# Altium integrated library 张方林_Library.IntLib: 375 symbols (part 2 of 3)
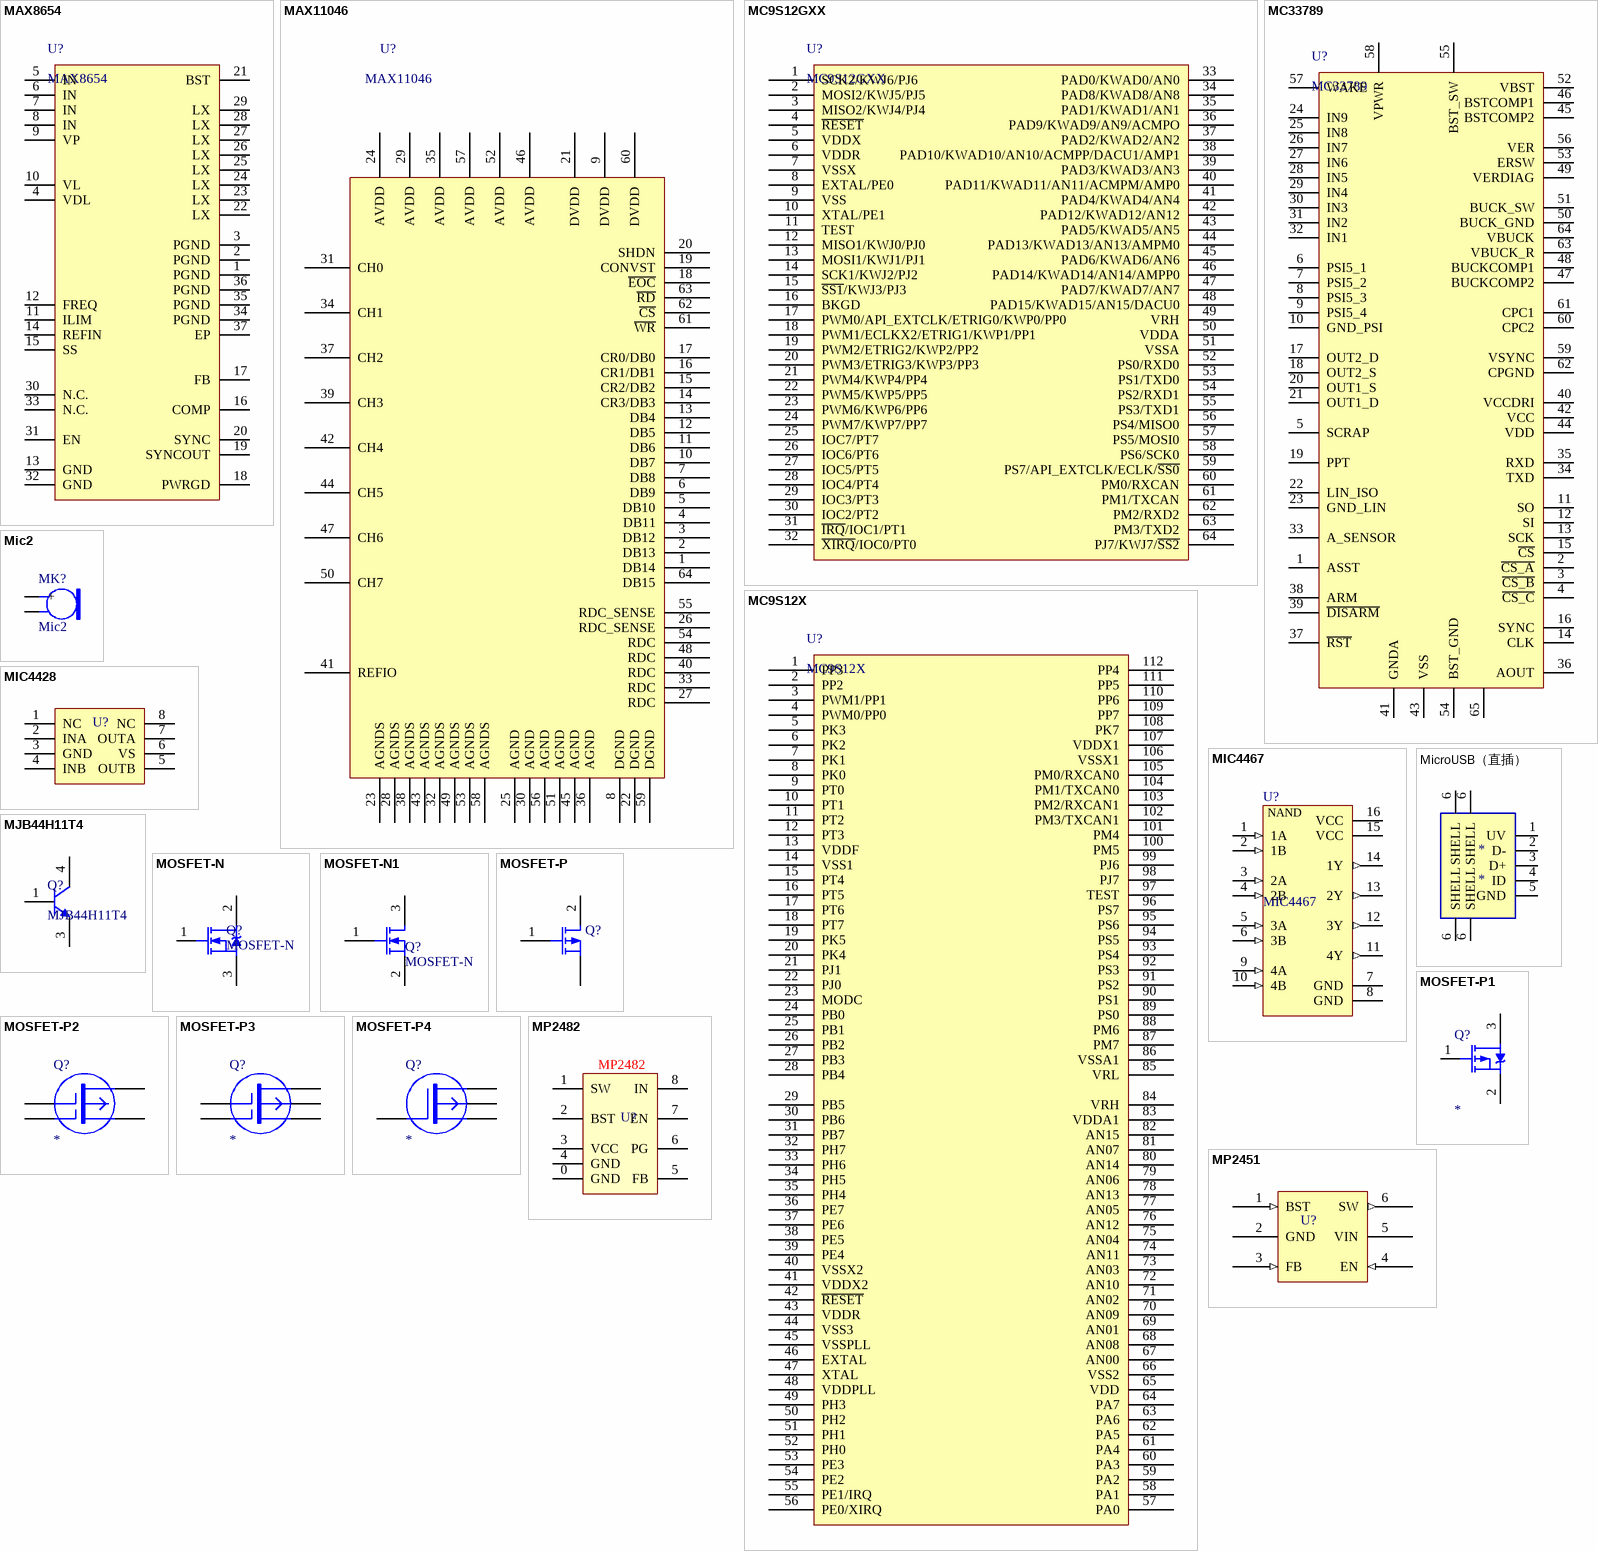
[diagram p20: symbols MAX8654 to MP2482]

## MC9S12X
designator U?
飞思卡尔单片机
footprint LQFP112 (Footprint not found)
pins: 1 PP3, 2 PP2, 3 PWM1/PP1, 4 PWM0/PP0, 5 PK3, 6 PK2, 7 PK1, 8 PK0, 9 PT0, 10 PT1, 11 PT2, 12 PT3, 13 VDDF, 14 VSS1, 15 PT4, 16 PT5, 17 PT6, 18 PT7, 19 PK5, 20 PK4, 21 PJ1, 22 PJ0, 23 MODC, 24 PB0, 25 PB1, 26 PB2, 27 PB3, 28 PB4, 29 PB5, 30 PB6, 31 PB7, 32 PH7, 33 PH6, 34 PH5, 35 PH4, 36 PE7, 37 PE6, 38 PE5, 39 PE4, 40 VSSX2, 41 VDDX2, 42 ~{RESET}, 43 VDDR, 44 VSS3, 45 VSSPLL, 46 EXTAL, 47 XTAL, 48 VDDPLL, 49 PH3, 50 PH2, 51 PH1, 52 PH0, 53 PE3, 54 PE2, 55 PE1/IRQ, 56 PE0/XIRQ, 57 PA0, 58 PA1, 59 PA2, 60 PA3, 61 PA4, 62 PA5, 63 PA6, 64 PA7, 65 VDD, 66 VSS2, 67 AN00, 68 AN08, 69 AN01, 70 AN09, 71 AN02, 72 AN10, 73 AN03, 74 AN11, 75 AN04, 76 AN12, 77 AN05, 78 AN13, 79 AN06, 80 AN14, 81 AN07, 82 AN15, 83 VDDA1, 84 VRH, 85 VRL, 86 VSSA1, 87 PM7, 88 PM6, 89 PS0, 90 PS1, 91 PS2, 92 PS3, 93 PS4, 94 PS5, 95 PS6, 96 PS7, 97 TEST, 98 PJ7, 99 PJ6, 100 PM5, 101 PM4, 102 PM3/TXCAN1, 103 PM2/RXCAN1, 104 PM1/TXCAN0, 105 PM0/RXCAN0, 106 VSSX1, 107 VDDX1, 108 PK7, 109 PP7, 110 PP6, 111 PP5, 112 PP4

## MC33789
designator U?
飞思卡尔传感器
footprint LQFP-64P (LQFP散热)
pins: 1 ASST, 2 ~{CS_A}, 3 ~{CS_B}, 4 ~{CS_C}, 5 SCRAP, 6 PSI5_1, 7 PSI5_2, 8 PSI5_3, 9 PSI5_4, 10 GND_PSI, 11 SO, 12 SI, 13 SCK, 14 CLK, 15 ~{CS}, 16 SYNC, 17 OUT2_D, 18 OUT2_S, 19 PPT, 20 OUT1_S, 21 OUT1_D, 22 LIN_ISO, 23 GND_LIN, 24 IN9, 25 IN8, 26 IN7, 27 IN6, 28 IN5, 29 IN4, 30 IN3, 31 IN2, 32 IN1, 33 A_SENSOR, 34 TXD, 35 RXD, 36 AOUT, 37 ~{RST}, 38 ARM, 39 ~{DISARM}, 40 VCCDRI, 41 GNDA, 42 VCC, 43 VSS, 44 VDD, 45 BSTCOMP2, 46 BSTCOMP1, 47 BUCKCOMP2, 48 BUCKCOMP1, 49 VERDIAG, 50 BUCK_GND, 51 BUCK_SW, 52 VBST, 53 ERSW, 54 BST_GND, 55 BST_SW, 56 VER, 57 WAKE, 58 VPWR, 59 VSYNC, 60 CPC2, 61 CPC1, 62 CPGND, 63 VBUCK_R, 64 VBUCK, 65

## Mic2
designator MK?
Microphone; Published: 24-Mar-1999; LatestRevisionDate: 17-Jul-2002; LatestRevisionNote: Re-released for DXP Platform.; PackageReference: PIN2; Publisher: Altium Limited
footprint PIN2 (Photosensitive Diode; 2 Leads)
footprint MIC
pins: 1 +, 2

## MIC4428
designator U?  (value not drawn)
缓冲器
footprint SOIC-NB-8
pins: 1 NC, 2 INA, 3 GND, 4 INB, 5 OUTB, 6 VS, 7 OUTA, 8 NC

## MIC4467
designator U?
Peripheral Driver; Package Information: Latest Revision: Jan-1998; Published: 15-May-2002; Datasheet: 1991 Interface Circuits Data Book (May-1990); Package Reference: D008; Publisher: Altium Limited
footprint SOIC-16W (SOIC)
pins: 1 1A (in), 2 1B (in), 3 2A (in), 4 2B (in), 5 3A (in), 6 3B (in), 7 GND, 8 GND, 9 4A (in), 10 4B (in), 11 4Y (out), 12 3Y (out), 13 2Y (out), 14 1Y (out), 15 VCC (power), 16 VCC (power)
text: NAND

## MicroUSB（直插）
designator *
footprint MINI  USB
footprint MicroUSB（直插）
footprint Micro USB
pins: 1 UV, 2 D-, 3 D+, 4 ID, 5 GND, 6 SHELL, 6 SHELL, 6 SHELL, 6 SHELL

## MJB44H11T4
designator Q?
footprint TO263-2 (LM2940/LM1086)
pins: 1 B, 3 E, 4 C

## MOSFET-N
designator Q?
N-Channel MOSFET; PackageDocument: 1995/1996; Published: 8-Jun-2000; LatestRevisionDate: 17-Jul-2002; LatestRevisionNote: Re-released for DXP Platform.; PackageReference: E3; Publisher: Altium Limited
footprint TO220-3 (TO, Thru-Hole, Vertical, Heatsink Mounted; 3 In-Line Leads; Pitch 2.54 mm)
footprint TO252-3 (D2-PAK)
pins: 1 G, 2 D, 3 S

## MOSFET-N1
designator Q?, comment MOSFET-N
MOSFET; Published: 8-Jun-2000; LatestRevisionDate: 17-Jul-2002; LatestRevisionNote: Re-released for DXP Platform.; PackageVersion: 1995/1996; PackageReference: E3; Publisher: Altium Limited
footprint SOT416
pins: 1 G, 2 S, 3 D

## MOSFET-P
designator Q?  (value not drawn)
P-Channel MOSFET; PackageDocument: 1995/1996; Published: 8-Jun-2000; LatestRevisionDate: 17-Jul-2002; LatestRevisionNote: Re-released for DXP Platform.; PackageReference: E3; Publisher: Altium Limited
footprint TO220-3 (TO, Thru-Hole, Vertical, Heatsink Mounted; 3 In-Line Leads; Pitch 2.54 mm)
pins: 1 G, 2 D, 3 S

## MOSFET-P1
designator Q?
footprint SOT23-3
pins: 1 G, 2 S, 3 D

## MOSFET-P2
designator Q?
pins: 1 G1, 2 G2, 3 D, 4 S

## MOSFET-P3
designator Q?
pins: 1 G1, 2 G2, 3 D, 4 U, 5 S

## MOSFET-P4
designator Q?
pins: 1 G, 2 D, 3 U, 4 S

## MP2451
designator U?  (value not drawn)
footprint SOT23-6
pins: 1 BST (in), 2 GND (power), 3 FB (in), 4 EN (in), 5 VIN (power), 6 SW (out)

## MP2482
designator U?  (value not drawn)
5A开关电源芯片
footprint POWERPARK SOP8
pins: 0 GND, 1 SW, 2 BST, 3 VCC, 4 GND, 5 FB, 6 PG, 7 EN, 8 IN

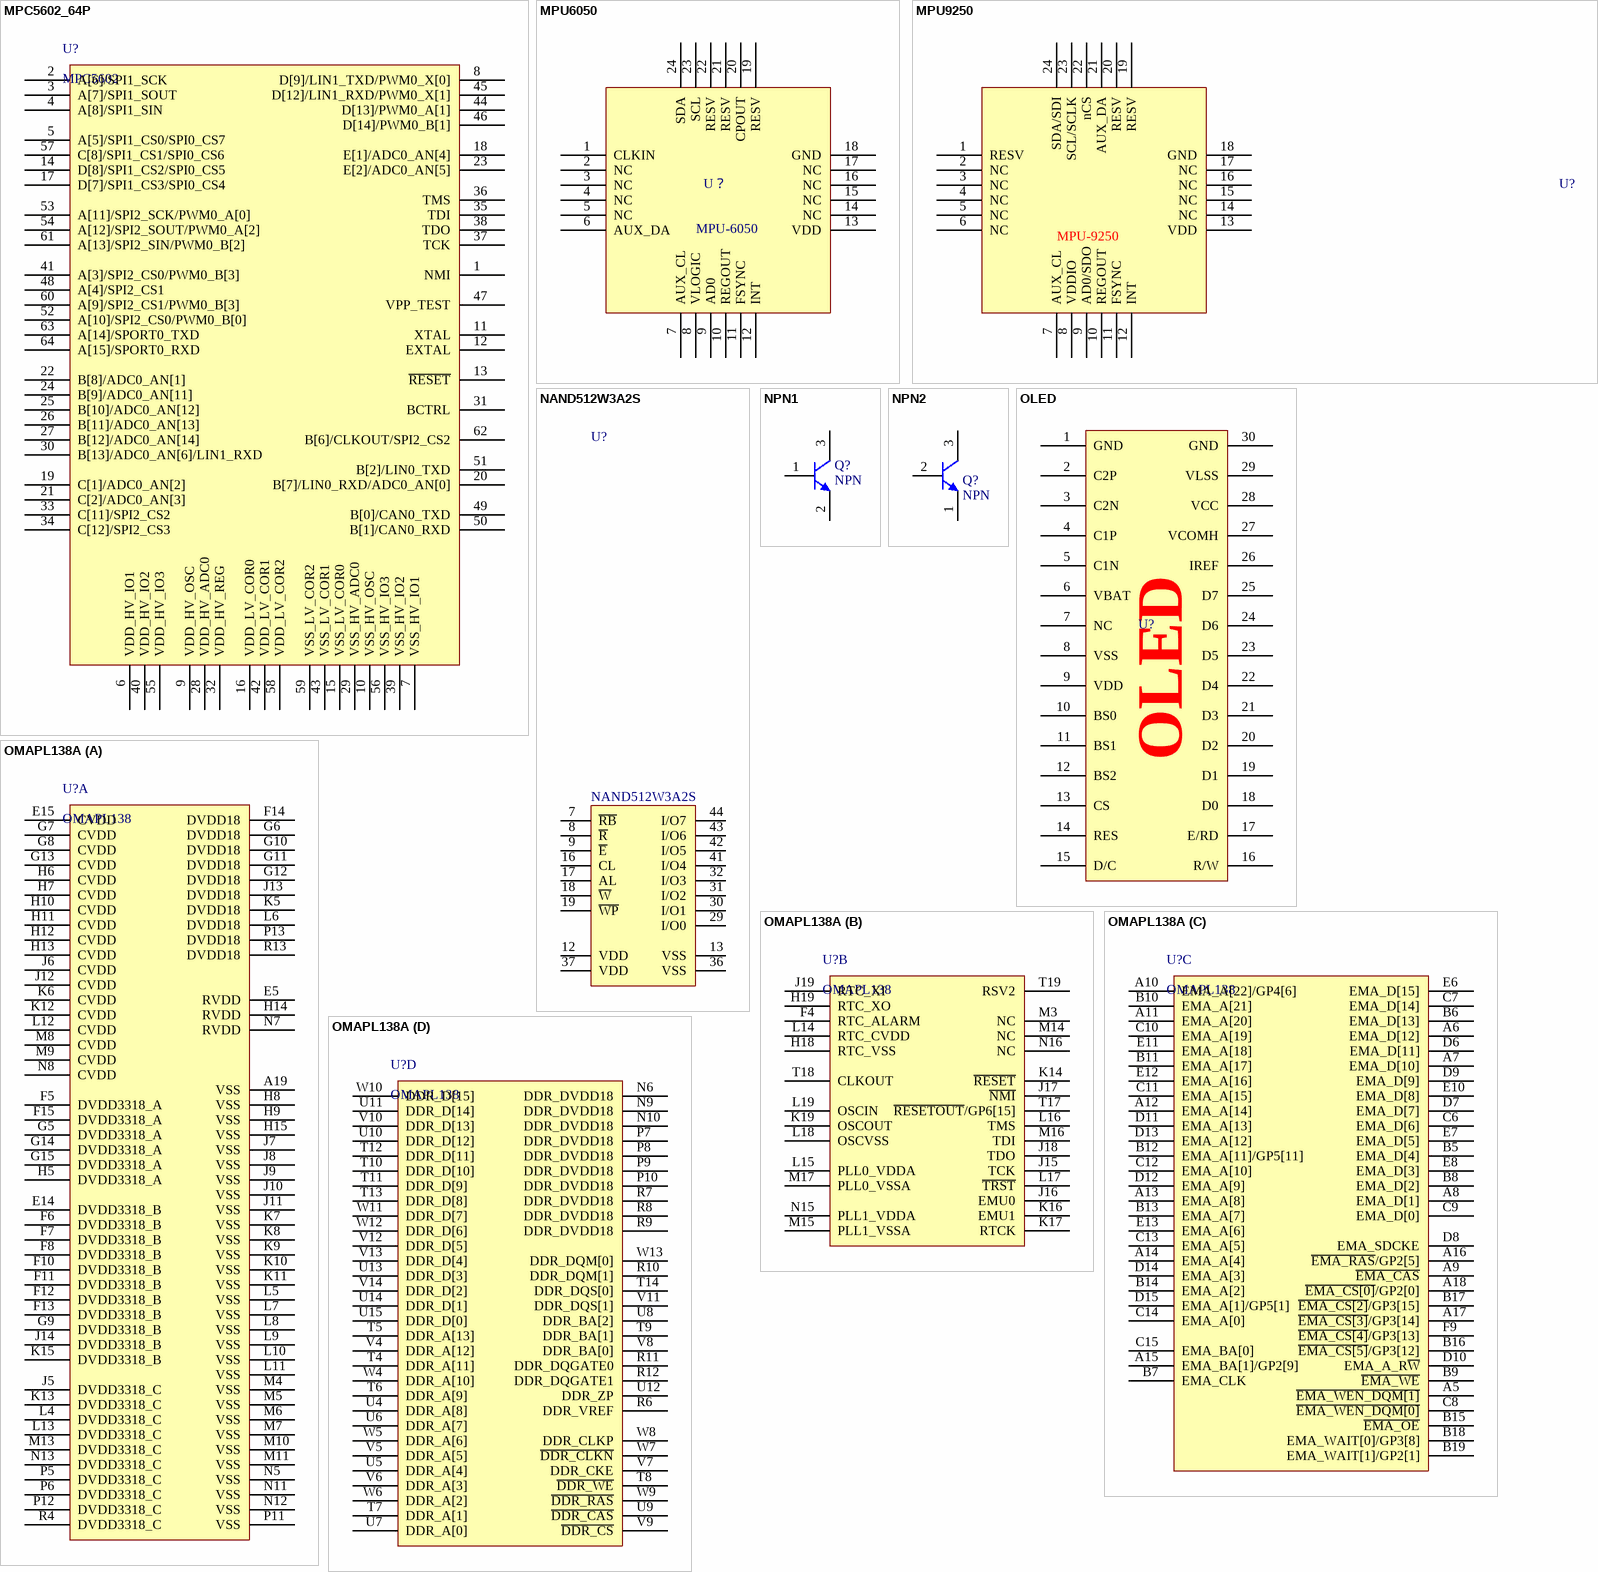
[diagram p9: symbols MPC5602_64P to OMAPL138A]

## MPC5602_64P
designator U?, comment MPC5602
Freescale PowerPC
footprint LQFP-64 (LQFP64)
pins: 1 NMI, 2 A[6]/SPI1_SCK, 3 A[7]/SPI1_SOUT, 4 A[8]/SPI1_SIN, 5 A[5]/SPI1_CS0/SPI0_CS7, 6 VDD_HV_IO1, 7 VSS_HV_IO1, 8 D[9]/LIN1_TXD/PWM0_X[0], 9 VDD_HV_OSC, 10 VSS_HV_OSC, 11 XTAL, 12 EXTAL, 13 ~{RESET}, 14 D[8]/SPI1_CS2/SPI0_CS5, 15 VSS_LV_COR0, 16 VDD_LV_COR0, 17 D[7]/SPI1_CS3/SPI0_CS4, 18 E[1]/ADC0_AN[4], 19 C[1]/ADC0_AN[2], 20 B[7]/LIN0_RXD/ADC0_AN[0], 21 C[2]/ADC0_AN[3], 22 B[8]/ADC0_AN[1], 23 E[2]/ADC0_AN[5], 24 B[9]/ADC0_AN[11], 25 B[10]/ADC0_AN[12], 26 B[11]/ADC0_AN[13], 27 B[12]/ADC0_AN[14], 28 VDD_HV_ADC0, 29 VSS_HV_ADC0, 30 B[13]/ADC0_AN[6]/LIN1_RXD, 31 BCTRL, 32 VDD_HV_REG, 33 C[11]/SPI2_CS2, 34 C[12]/SPI2_CS3, 35 TDI, 36 TMS, 37 TCK, 38 TDO, 39 VSS_HV_IO2, 40 VDD_HV_IO2, 41 A[3]/SPI2_CS0/PWM0_B[3], 42 VDD_LV_COR1, 43 VSS_LV_COR1, 44 D[13]/PWM0_A[1], 45 D[12]/LIN1_RXD/PWM0_X[1], 46 D[14]/PWM0_B[1], 47 VPP_TEST, 48 A[4]/SPI2_CS1, 49 B[0]/CAN0_TXD, 50 B[1]/CAN0_RXD, 51 B[2]/LIN0_TXD, 52 A[10]/SPI2_CS0/PWM0_B[0], 53 A[11]/SPI2_SCK/PWM0_A[0], 54 A[12]/SPI2_SOUT/PWM0_A[2], 55 VDD_HV_IO3, 56 VSS_HV_IO3, 57 C[8]/SPI1_CS1/SPI0_CS6, 58 VDD_LV_COR2, 59 VSS_LV_COR2, 60 A[9]/SPI2_CS1/PWM0_B[3], 61 A[13]/SPI2_SIN/PWM0_B[2], 62 B[6]/CLKOUT/SPI2_CS2, 63 A[14]/SPORT0_TXD, 64 A[15]/SPORT0_RXD

## MPU6050
designator U？  (value not drawn)
footprint MPU6050
pins: 1 CLKIN, 2 NC, 3 NC, 4 NC, 5 NC, 6 AUX_DA, 7 AUX_CL, 8 VLOGIC, 9 AD0, 10 REGOUT, 11 FSYNC, 12 INT, 13 VDD, 14 NC, 15 NC, 16 NC, 17 NC, 18 GND, 19 RESV, 20 CPOUT, 21 RESV, 22 RESV, 23 SCL, 24 SDA
text: MPU-6050

## MPU9250
designator U?  (value not drawn)
九轴陀螺仪
footprint MPU9250
pins: 1 RESV, 2 NC, 3 NC, 4 NC, 5 NC, 6 NC, 7 AUX_CL, 8 VDDIO, 9 AD0/SDO, 10 REGOUT, 11 FSYNC, 12 INT, 13 VDD, 14 NC, 15 NC, 16 NC, 17 NC, 18 GND, 19 RESV, 20 RESV, 21 AUX_DA, 22 nCS, 23 SCL/SCLK, 24 SDA/SDI
text: MPU-9250

## NAND512W3A2S
designator U?
NANDFLASH
footprint TSOP-48
pins: 1 NC hidden, 2 NC hidden, 3 NC hidden, 4 NC hidden, 5 NC hidden, 6 NC hidden, 7 ~{RB}, 8 ~{R}, 9 ~{E}, 10 NC hidden, 11 NC hidden, 12 VDD, 13 VSS, 14 NC hidden, 15 NC hidden, 16 CL, 17 AL, 18 ~{W}, 19 ~{WP}, 20 NC hidden, 21 NC hidden, 22 NC hidden, 23 NC hidden, 24 NC hidden, 25 NC hidden, 26 NC hidden, 27 NC hidden, 28 NC hidden, 29 I/O0, 30 I/O1, 31 I/O2, 32 I/O3, 33 NC hidden, 34 NC hidden, 35 NC hidden, 36 VSS, 37 VDD, 38 NC hidden, 39 NC hidden, 40 NC hidden, 41 I/O4, 42 I/O5, 43 I/O6, 44 I/O7, 45 NC hidden, 46 NC hidden, 47 NC hidden, 48 NC hidden

## NPN1
designator Q?, comment NPN
贴片三极管; Published: 8-Jun-2000; LatestRevisionDate: 15-Jan-2003; LatestRevisionNote: PCB Footprint 'BCY-W3/D4.7' replaced; DatasheetDocument: 1997; PackageDocument: Sep-1998; PackageReference: TO-92A; Publisher: Altium Limited; Code_JEDEC: TO-92A; ComponentLink1Description: Manufacturer Link; ComponentLink1URL: http://www.fairchildsemi.com/; ComponentLink2Description: Datasheet; ComponentLink2URL: http://www.fairchildsemi.com/ds/2N%2F2N3904.pdf
footprint SOT23-3
pins: 1 B, 2 E, 3 C

## NPN2
designator Q?, comment NPN
三极管; Published: 8-Jun-2000; LatestRevisionDate: 15-Jan-2003; LatestRevisionNote: PCB Footprint 'BCY-W3/D4.7' replaced; DatasheetDocument: 1997; PackageDocument: Sep-1998; PackageReference: TO-92A; Publisher: Altium Limited; Code_JEDEC: TO-92A; ComponentLink1Description: Manufacturer Link; ComponentLink1URL: http://www.fairchildsemi.com/; ComponentLink2Description: Datasheet; ComponentLink2URL: http://www.fairchildsemi.com/ds/2N%2F2N3904.pdf
footprint TO-92A (TO, Flat Index; 3 In-Line, Axial Leads; Body Dia. 4.5mm; Leads 0.51 x 0.48 mm (max))
pins: 1 E, 2 B, 3 C

## OLED
designator U?  (value not drawn)
footprint OLED
pins: 1 GND, 2 C2P, 3 C2N, 4 C1P, 5 C1N, 6 VBAT, 7 NC, 8 VSS, 9 VDD, 10 BS0, 11 BS1, 12 BS2, 13 CS, 14 RES, 15 D/C, 16 R/W, 17 E/RD, 18 D0, 19 D1, 20 D2, 21 D3, 22 D4, 23 D5, 24 D6, 25 D7, 26 IREF, 27 VCOMH, 28 VCC, 29 VLSS, 30 GND

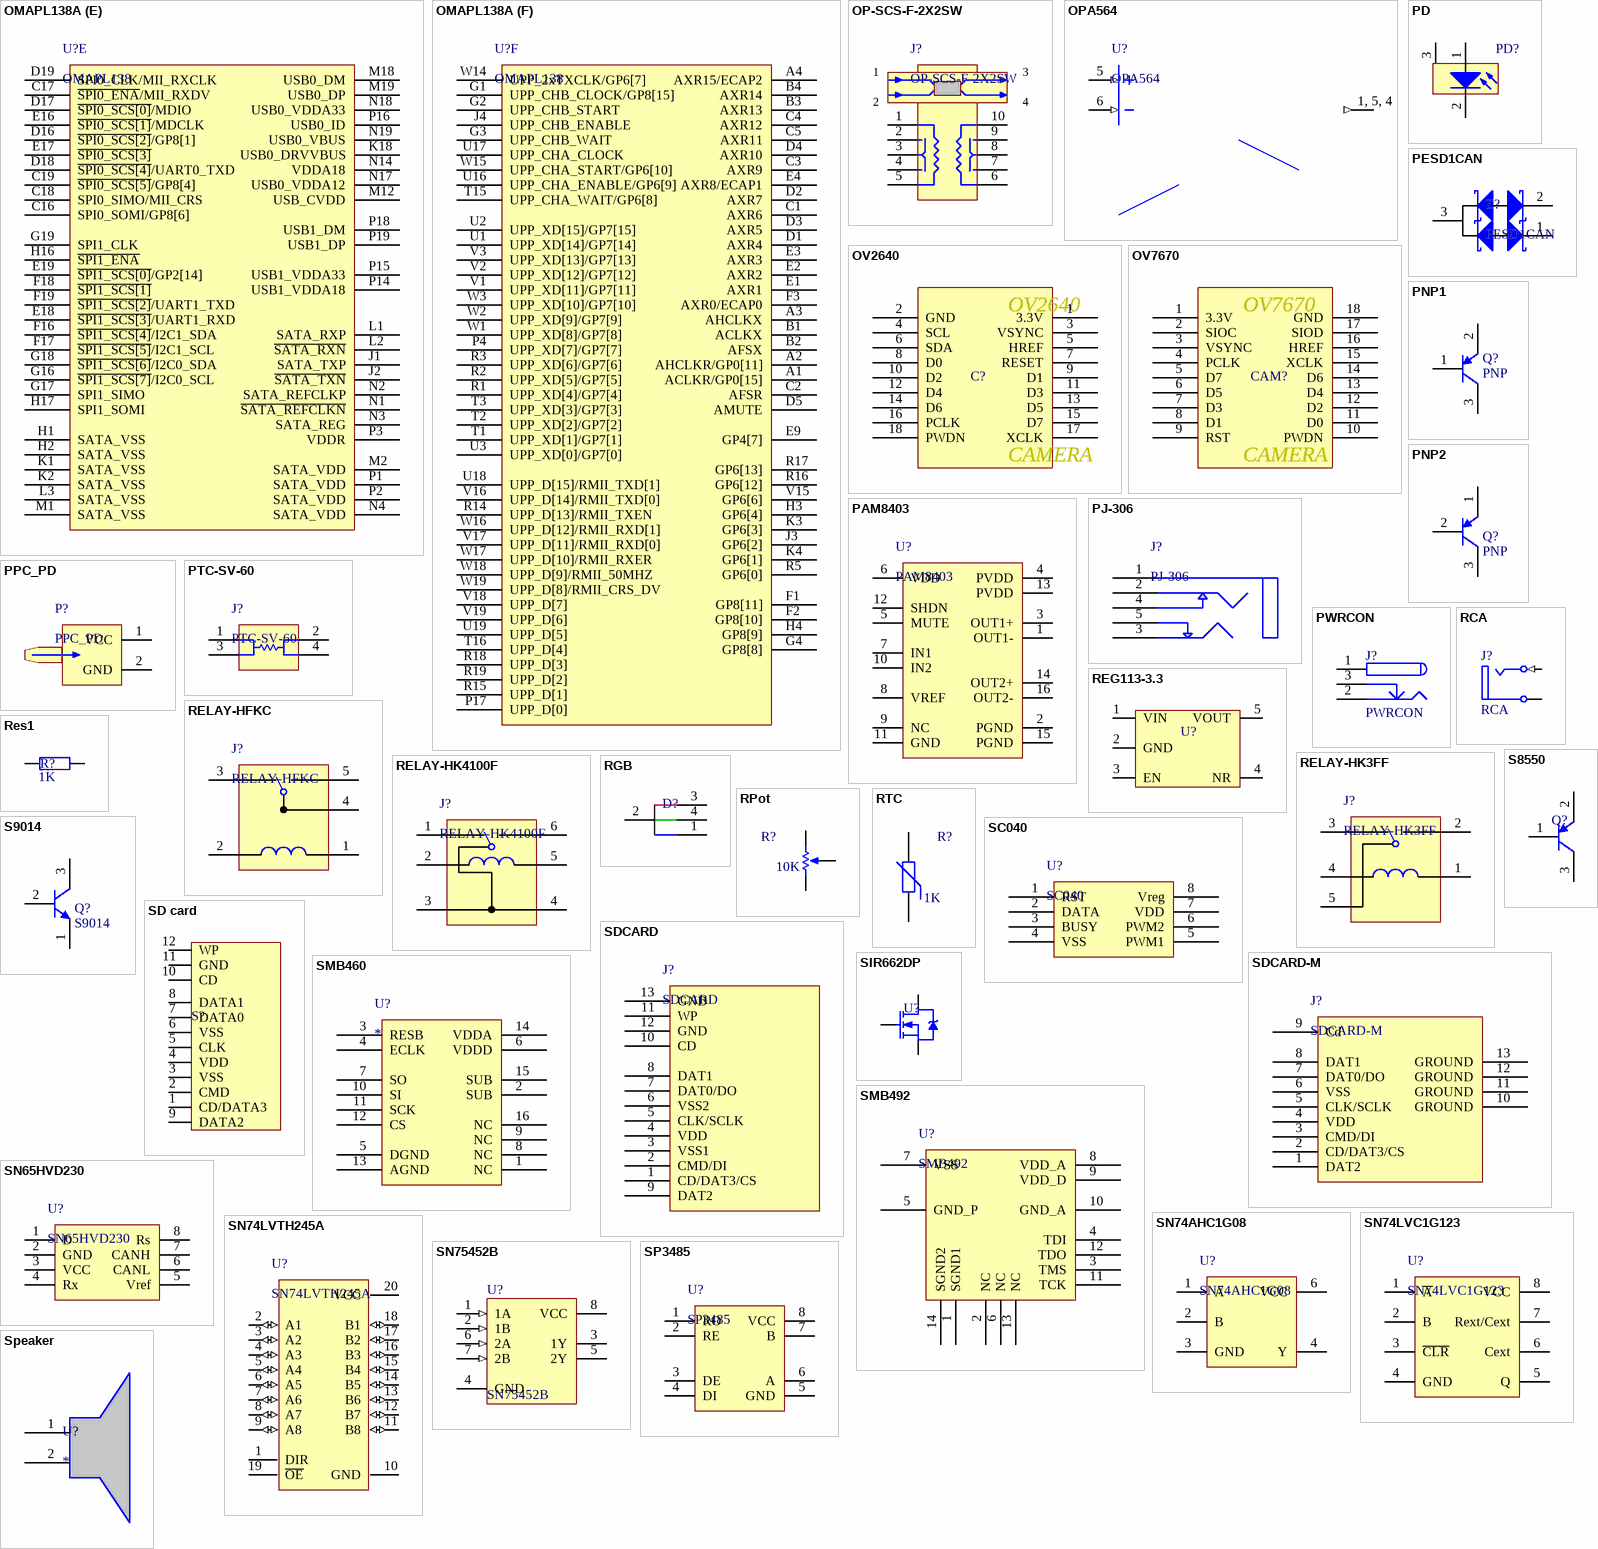
[diagram p10: symbols OMAPL138A to Speaker]

## OMAPL138A
designator U?, comment OMAPL138
DSP&ARM
footprint UFBGA361
part A pins: A19 VSS, E5 RVDD, E14 DVDD3318_B, E15 CVDD, F5 DVDD3318_A, F6 DVDD3318_B, F7 DVDD3318_B, F8 DVDD3318_B, F10 DVDD3318_B, F11 DVDD3318_B, F12 DVDD3318_B, F13 DVDD3318_B, F14 DVDD18, F15 DVDD3318_A, G5 DVDD3318_A, G6 DVDD18, G7 CVDD, G8 CVDD, G9 DVDD3318_B, G10 DVDD18, G11 DVDD18, G12 DVDD18, G13 CVDD, G14 DVDD3318_A, G15 DVDD3318_A, H5 DVDD3318_A, H6 CVDD, H7 CVDD, H8 VSS, H9 VSS, H10 CVDD, H11 CVDD, H12 CVDD, H13 CVDD, H14 RVDD, H15 VSS, J5 DVDD3318_C, J6 CVDD, J7 VSS, J8 VSS, J9 VSS, J10 VSS, J11 VSS, J12 CVDD, J13 DVDD18, J14 DVDD3318_B, K5 DVDD18, K6 CVDD, K7 VSS, K8 VSS, K9 VSS, K10 VSS, K11 VSS, K12 CVDD, K13 DVDD3318_C, K15 DVDD3318_B, L4 DVDD3318_C, L5 VSS, L6 DVDD18, L7 VSS, L8 VSS, L9 VSS, L10 VSS, L11 VSS, L12 CVDD, L13 DVDD3318_C, M4 VSS, M5 VSS, M6 VSS, M7 VSS, M8 CVDD, M9 CVDD, M10 VSS, M11 VSS, M13 DVDD3318_C, N5 VSS, N7 RVDD, N8 CVDD, N11 VSS, N12 VSS, N13 DVDD3318_C, P5 DVDD3318_C, P6 DVDD3318_C, P11 VSS, P12 DVDD3318_C, P13 DVDD18, R4 DVDD3318_C, R13 DVDD18
part B pins: F4 RTC_ALARM, H18 RTC_VSS, H19 RTC_XO, J15 TCK, J16 EMU0, J17 ~{NMI}, J18 TDO, J19 RTC_XI, K14 ~{RESET}, K16 EMU1, K17 RTCK, K19 OSCOUT, L14 RTC_CVDD, L15 PLL0_VDDA, L16 TMS, L17 ~{TRST}, L18 OSCVSS, L19 OSCIN, M3 NC, M14 NC, M15 PLL1_VSSA, M16 TDI, M17 PLL0_VSSA, N15 PLL1_VDDA, N16 NC, T17 ~{RESETOUT}/GP6[15], T18 CLKOUT, T19 RSV2
part C pins: A5 ~{EMA_WEN_DQM[1]}, A6 EMA_D[12], A7 EMA_D[10], A8 EMA_D[1], A9 ~{EMA_CAS}, A10 EMA_A[22]/GP4[6], A11 EMA_A[20], A12 EMA_A[14], A13 EMA_A[8], A14 EMA_A[4], A15 EMA_BA[1]/GP2[9], A16 ~{EMA_RAS}/GP2[5], A17 ~{EMA_CS[3]}/GP3[14], A18 ~{EMA_CS[0]}/GP2[0], B5 EMA_D[4], B6 EMA_D[13], B7 EMA_CLK, B8 EMA_D[2], B9 ~{EMA_WE}, B10 EMA_A[21], B11 EMA_A[17], B12 EMA_A[11]/GP5[11], B13 EMA_A[7], B14 EMA_A[2], B15 ~{EMA_OE}, B16 ~{EMA_CS[5]}/GP3[12], B17 ~{EMA_CS[2]}/GP3[15], B18 EMA_WAIT[0]/GP3[8], B19 EMA_WAIT[1]/GP2[1], C6 EMA_D[6], C7 EMA_D[14], C8 ~{EMA_WEN_DQM[0]}, C9 EMA_D[0], C10 EMA_A[19], C11 EMA_A[15], C12 EMA_A[10], C13 EMA_A[5], C14 EMA_A[0], C15 EMA_BA[0], D6 EMA_D[11], D7 EMA_D[7], D8 EMA_SDCKE, D9 EMA_D[9], D10 EMA_A_R~{W}, D11 EMA_A[13], D12 EMA_A[9], D13 EMA_A[12], D14 EMA_A[3], D15 EMA_A[1]/GP5[1], E6 EMA_D[15], E7 EMA_D[5], E8 EMA_D[3], E10 EMA_D[8], E11 EMA_A[18], E12 EMA_A[16], E13 EMA_A[6], F9 ~{EMA_CS[4]}/GP3[13]
part D pins: N6 DDR_DVDD18, N9 DDR_DVDD18, N10 DDR_DVDD18, P7 DDR_DVDD18, P8 DDR_DVDD18, P9 DDR_DVDD18, P10 DDR_DVDD18, R6 DDR_VREF, R7 DDR_DVDD18, R8 DDR_DVDD18, R9 DDR_DVDD18, R10 DDR_DQM[1], R11 DDR_DQGATE0, R12 DDR_DQGATE1, T4 DDR_A[11], T5 DDR_A[13], T6 DDR_A[9], T7 DDR_A[1], T8 ~{DDR_WE}, T9 DDR_BA[1], T10 DDR_D[10], T11 DDR_D[9], T12 DDR_D[11], T13 DDR_D[8], T14 DDR_DQS[0], U4 DDR_A[8], U5 DDR_A[4], U6 DDR_A[7], U7 DDR_A[0], U8 DDR_BA[2], U9 ~{DDR_CAS}, U10 DDR_D[12], U11 DDR_D[14], U12 DDR_ZP, U13 DDR_D[3], U14 DDR_D[1], U15 DDR_D[0], V4 DDR_A[12], V5 DDR_A[5], V6 DDR_A[3], V7 DDR_CKE, V8 DDR_BA[0], V9 ~{DDR_CS}, V10 DDR_D[13], V11 DDR_DQS[1], V12 DDR_D[5], V13 DDR_D[4], V14 DDR_D[2], W4 DDR_A[10], W5 DDR_A[6], W6 DDR_A[2], W7 ~{DDR_CLKN}, W8 DDR_CLKP, W9 ~{DDR_RAS}, W10 DDR_D[15], W11 DDR_D[7], W12 DDR_D[6], W13 DDR_DQM[0]
part E pins: C16 SPI0_SOMI/GP8[6], C17 ~{SPI0_ENA}/MII_RXDV, C18 SPI0_SIMO/MII_CRS, C19 ~{SPI0_SCS[5]}/GP8[4], D16 ~{SPI0_SCS[2]}/GP8[1], D17 ~{SPI0_SCS[0]}/MDIO, D18 ~{SPI0_SCS[4]}/UART0_TXD, D19 SPI0_CLK/MII_RXCLK, E16 ~{SPI0_SCS[1]}/MDCLK, E17 ~{SPI0_SCS[3]}, E18 ~{SPI1_SCS[3]}/UART1_RXD, E19 ~{SPI1_SCS[0]}/GP2[14], F16 ~{SPI1_SCS[4]}/I2C1_SDA, F17 ~{SPI1_SCS[5]}/I2C1_SCL, F18 ~{SPI1_SCS[1]}, F19 ~{SPI1_SCS[2]}/UART1_TXD, G16 ~{SPI1_SCS[7]}/I2C0_SCL, G17 SPI1_SIMO, G18 ~{SPI1_SCS[6]}/I2C0_SDA, G19 SPI1_CLK, H1 SATA_VSS, H2 SATA_VSS, H16 ~{SPI1_ENA}, H17 SPI1_SOMI, J1 SATA_TXP, J2 ~{SATA_TXN}, K1 SATA_VSS, K2 SATA_VSS, K18 USB0_DRVVBUS, L1 SATA_RXP, L2 ~{SATA_RXN}, L3 SATA_VSS, M1 SATA_VSS, M2 SATA_VDD, M12 USB_CVDD, M18 USB0_DM, M19 USB0_DP, N1 ~{SATA_REFCLKN}, N2 SATA_REFCLKP, N3 SATA_REG, N4 SATA_VDD, N14 VDDA18, N17 USB0_VDDA12, N18 USB0_VDDA33, N19 USB0_VBUS, P1 SATA_VDD, P2 SATA_VDD, P3 VDDR, P14 USB1_VDDA18, P15 USB1_VDDA33, P16 USB0_ID, P18 USB1_DM, P19 USB1_DP
part F pins: A1 ACLKR/GP0[15], A2 AHCLKR/GP0[11], A3 AHCLKX, A4 AXR15/ECAP2, B1 ACLKX, B2 AFSX, B3 AXR13, B4 AXR14, C1 AXR6, C2 AFSR, C3 AXR9, C4 AXR12, C5 AXR11, D1 AXR4, D2 AXR7, D3 AXR5, D4 AXR10, D5 AMUTE, E1 AXR1, E2 AXR2, E3 AXR3, E4 AXR8/ECAP1, E9 GP4[7], F1 GP8[11], F2 GP8[10], F3 AXR0/ECAP0, G1 UPP_CHB_CLOCK/GP8[15], G2 UPP_CHB_START, G3 UPP_CHB_WAIT, G4 GP8[8], H3 GP6[4], H4 GP8[9], J3 GP6[2], J4 UPP_CHB_ENABLE, K3 GP6[3], K4 GP6[1], P4 UPP_XD[7]/GP7[7], P17 UPP_D[0], R1 UPP_XD[4]/GP7[4], R2 UPP_XD[5]/GP7[5], R3 UPP_XD[6]/GP7[6], R5 GP6[0], R14 UPP_D[13]/RMII_TXEN, R15 UPP_D[1], R16 GP6[12], R17 GP6[13], R18 UPP_D[3], R19 UPP_D[2], T1 UPP_XD[1]/GP7[1], T2 UPP_XD[2]/GP7[2], T3 UPP_XD[3]/GP7[3], T15 UPP_CHA_WAIT/GP6[8], T16 UPP_D[4], U1 UPP_XD[14]/GP7[14], U2 UPP_XD[15]/GP7[15], U3 UPP_XD[0]/GP7[0], U16 UPP_CHA_ENABLE/GP6[9], U17 UPP_CHA_CLOCK, U18 UPP_D[15]/RMII_TXD[1], U19 UPP_D[5], V1 UPP_XD[11]/GP7[11], V2 UPP_XD[12]/GP7[12], V3 UPP_XD[13]/GP7[13], V15 GP6[6], V16 UPP_D[14]/RMII_TXD[0], V17 UPP_D[11]/RMII_RXD[0], V18 UPP_D[7], V19 UPP_D[6], W1 UPP_XD[8]/GP7[8], W2 UPP_XD[9]/GP7[9], W3 UPP_XD[10]/GP7[10], W14 UPP_2xTXCLK/GP6[7], W15 UPP_CHA_START/GP6[10], W16 UPP_D[12]/RMII_RXD[1], W17 UPP_D[10]/RMII_RXER, W18 UPP_D[9]/RMII_50MHZ, W19 UPP_D[8]/RMII_CRS_DV

## OP-SCS-F-2X2SW
designator J?
光开关
footprint SCS-F-2X2
pins: 1 SWA, 2 SWAK1, 3 SWAK2, 4 SWAK3, 5 SWA, 6 SWB, 7 SWBK3, 8 SWBK2, 9 SWBK1, 10 SWB

## OPA564
designator U?
功率运算放大器
footprint TSSOP-20P (TSOP, 20-Leads, Body 6.5x4.4mm, Pitch 0.65mm, IPC Low Density)
pins: 1, 5, 4  OUT (out), 5 IN+ (in), 6 IN- (in)

## OV2640
designator C?  (value not drawn)
摄像头
footprint OV2640
pins: 1 3.3V, 2 GND, 3 VSYNC, 4 SCL, 5 HREF, 6 SDA, 7 RESET, 8 D0, 9 D1, 10 D2, 11 D3, 12 D4, 13 D5, 14 D6, 15 D7, 16 PCLK, 17 XCLK, 18 PWDN
text: CAMERA

## OV7670
designator CAM?  (value not drawn)
摄像头
footprint OV7670
pins: 1 3.3V, 2 SIOC, 3 VSYNC, 4 PCLK, 5 D7, 6 D5, 7 D3, 8 D1, 9 RST, 10 PWDN, 11 D0, 12 D2, 13 D4, 14 D6, 15 XCLK, 16 HREF, 17 SIOD, 18 GND
text: CAMERA

## PAM8403
designator U?
音频运放
footprint SOIC-16
pins: 1 OUT1-, 2 PGND, 3 OUT1+, 4 PVDD, 5 MUTE, 6 VDD, 7 IN1, 8 VREF, 9 NC, 10 IN2, 11 GND, 12 SHDN, 13 PVDD, 14 OUT2+, 15 PGND, 16 OUT2-

## PD
designator PD?  (value not drawn)
光电二极管; Published: 24-Mar-1999; LatestRevisionDate: 17-Jul-2002; LatestRevisionNote: Re-released for DXP Platform.; Publisher: Altium Limited; PackageReference: PD
footprint PD
footprint PD-SMD (光电二极管)
footprint PD-H (光电二极管)
pins: 1 A, 2 K, 3 0

## PESD1CAN
designator Z?
过压保护
footprint SOT23-3
pins: 1, 2, 3

## PJ-306
designator J?
立体声耳机插座
footprint PJ-315-B (立体声耳机插座)
footprint PJ-306 (立体声耳机插座)
footprint 3F07 (立体声耳机插座)
pins: 1 COM, 2 L, 3 R, 4 L1, 5 R1

## PNP1
designator Q?, comment PNP
贴片三极管; Published: 8-Jun-2000; LatestRevisionDate: 15-Jan-2003; LatestRevisionNote: PCB Footprint 'BCY-W3/D4.7' replaced; DatasheetDocument: 1997; PackageDocument: Sep-1998; PackageReference: TO-92A; Publisher: Altium Limited; Code_JEDEC: TO-92A; ComponentLink1Description: Manufacturer Link; ComponentLink1URL: http://www.fairchildsemi.com/; ComponentLink2Description: Datasheet; ComponentLink2URL: http://www.fairchildsemi.com/ds/2N%2F2N3906.pdf
footprint SOT23-3
pins: 1 B, 2 E, 3 C

## PNP2
designator Q?, comment PNP
三极管; Published: 8-Jun-2000; LatestRevisionDate: 15-Jan-2003; LatestRevisionNote: PCB Footprint 'BCY-W3/D4.7' replaced; DatasheetDocument: 1997; PackageDocument: Sep-1998; PackageReference: TO-92A; Publisher: Altium Limited; Code_JEDEC: TO-92A; ComponentLink1Description: Manufacturer Link; ComponentLink1URL: http://www.fairchildsemi.com/; ComponentLink2Description: Datasheet; ComponentLink2URL: http://www.fairchildsemi.com/ds/2N%2F2N3906.pdf
footprint TO-92A (TO, Flat Index; 3 In-Line, Axial Leads; Body Dia. 4.5mm; Leads 0.51 x 0.48 mm (max))
pins: 1 E, 2 B, 3 C

## PPC_PD
designator P?
footprint PPC_PD
pins: 1 VCC, 2 GND